# Altium integrated library AltiumLibs.IntLib: 395 symbols (part 2 of 2)
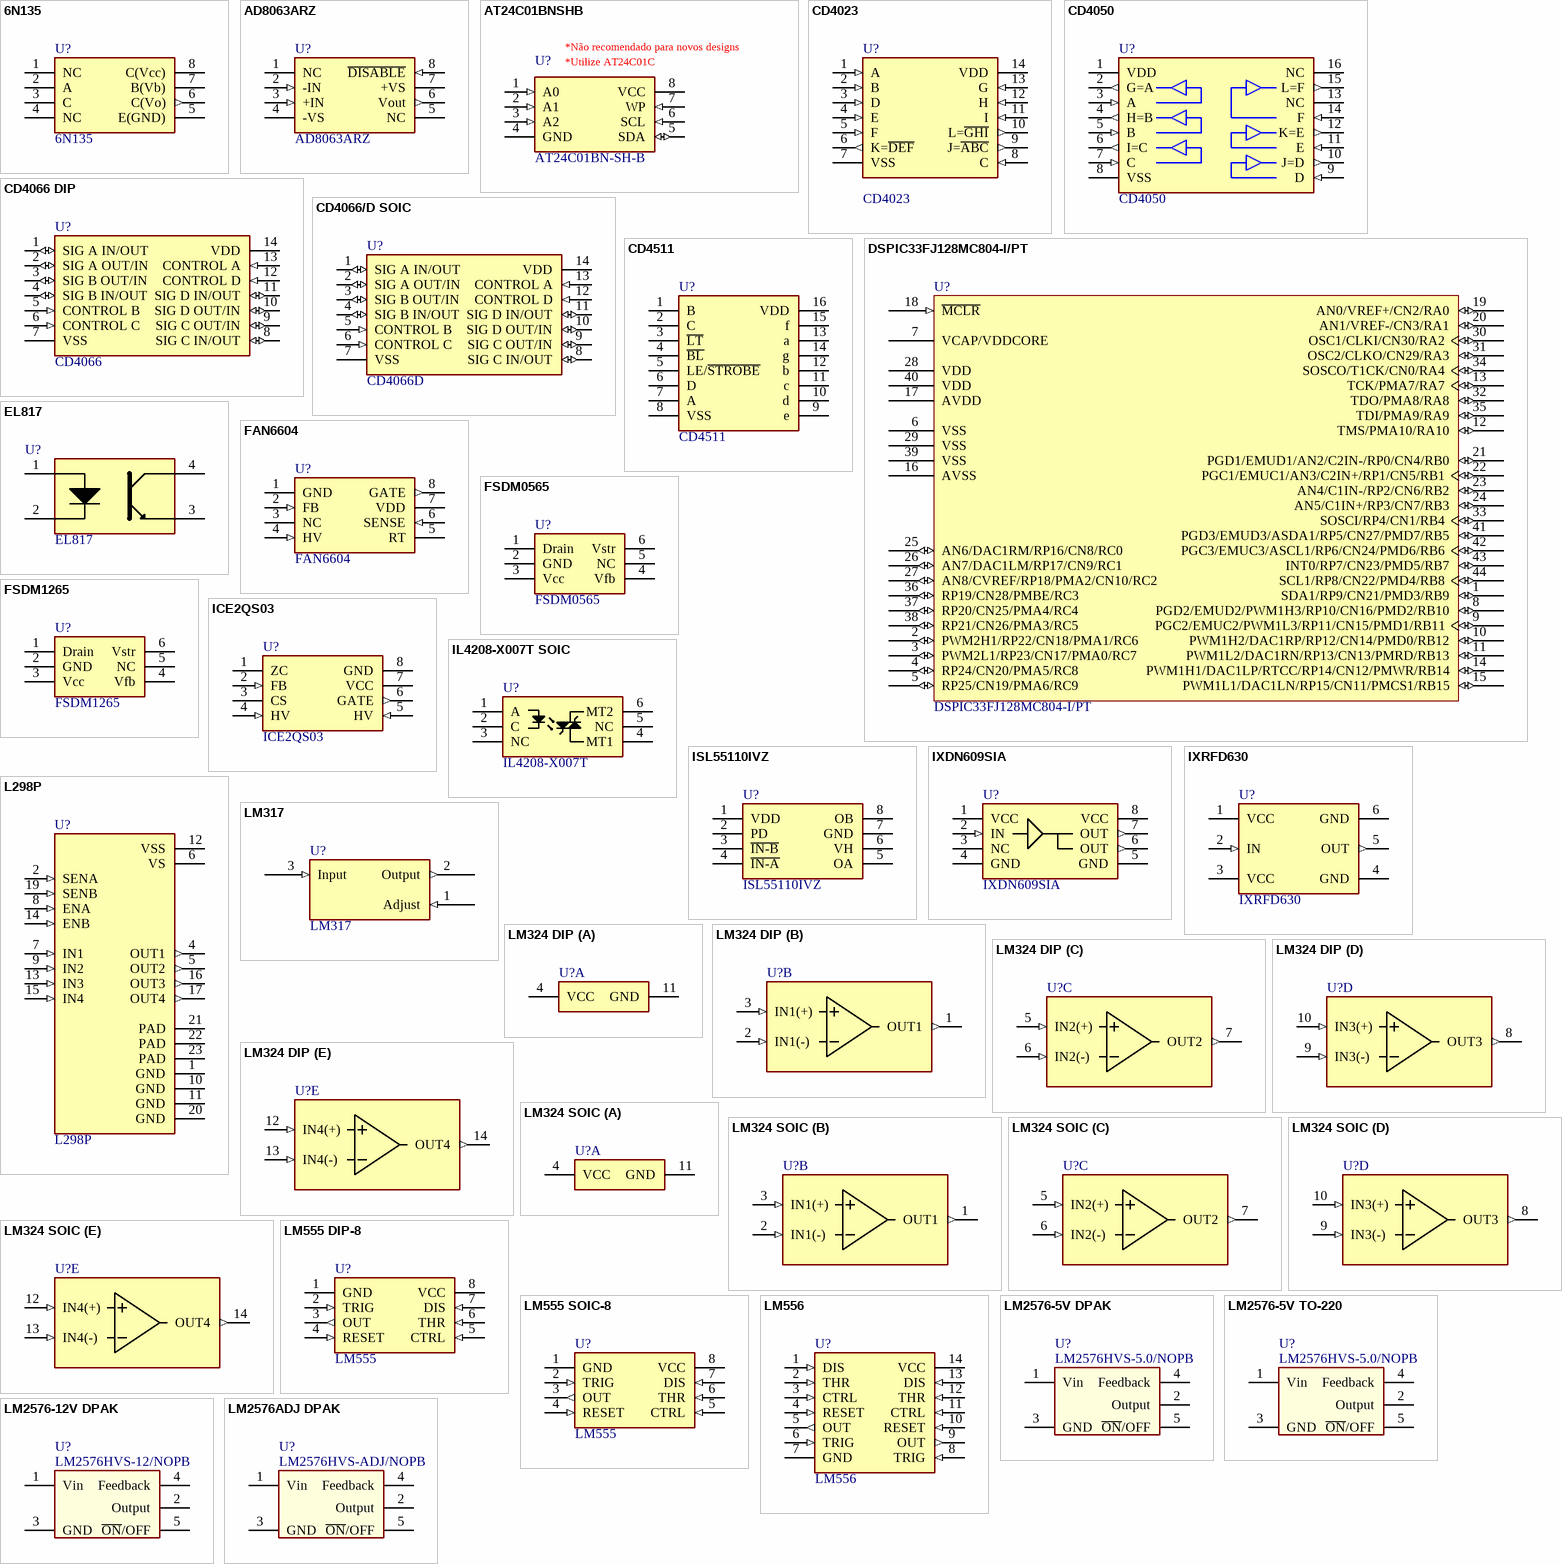
[diagram p16: symbols 6N135 to LM2576ADJ DPAK]

## LM324 DIP
designator U?  (value not drawn)
LM324 DIP Quad Operational Amplifier; Montagem: PTH; ComponentLink1Description: Datasheet; ComponentLink1URL: https://www.fairchildsemi.com/datasheets/LM/LM324.pdf; Fabricante: *; Valor/Partnumber: LM324
footprint DIP14
part A pins: 4 VCC (power), 11 GND (power)
part B pins: 1 OUT1 (out), 2 IN1(-) (in), 3 IN1(+) (in)
part C pins: 5 IN2(+) (in), 6 IN2(-) (in), 7 OUT2 (out)
part D pins: 8 OUT3 (out), 9 IN3(-) (in), 10 IN3(+) (in)
part E pins: 12 IN4(+) (in), 13 IN4(-) (in), 14 OUT4 (out)

## LM324 SOIC
designator U?  (value not drawn)
LM324 SOIC Quad Operational Amplifier; Montagem: SMD; ComponentLink1Description: Datasheet; ComponentLink1URL: https://www.fairchildsemi.com/datasheets/LM/LM324.pdf; Fabricante: *; Valor/Partnumber: LM324
footprint DIP14
part A pins: 4 VCC (power), 11 GND (power)
part B pins: 1 OUT1 (out), 2 IN1(-) (in), 3 IN1(+) (in)
part C pins: 5 IN2(+) (in), 6 IN2(-) (in), 7 OUT2 (out)
part D pins: 8 OUT3 (out), 9 IN3(-) (in), 10 IN3(+) (in)
part E pins: 12 IN4(+) (in), 13 IN4(-) (in), 14 OUT4 (out)

## LM555 DIP-8
designator U?, comment Valor/Partnumber: LM555  (hidden comment: LM555 Timer)
LM555 Timer DIP; Montagem: PTH; Fabricante: Texas; ComponentLink1Description: Datasheet; ComponentLink1URL: http://www.ti.com/lit/ds/symlink/lm555.pdf
footprint DIP8
pins: 1 GND (power), 2 TRIG (in), 3 OUT (out), 4 RESET (in), 5 CTRL (in), 6 THR (in), 7 DIS (in), 8 VCC (power)

## LM555 SOIC-8
designator U?, comment Valor/Partnumber: LM555  (hidden comment: LM555 Timer SOIC)
Montagem: SMD; Fabricante: Texas; ComponentLink1Description: Datasheet; ComponentLink1URL: http://www.ti.com/lit/ds/symlink/lm555.pdf
footprint SOIC-8 (SOIC, 8-Leads, Body 5,0x4,0mm (max), Pitch 1,27mm, IPC Medium Density)
pins: 1 GND (power), 2 TRIG (in), 3 OUT (out), 4 RESET (in), 5 CTRL (in), 6 THR (in), 7 DIS (in), 8 VCC (power)

## LM556
designator U?, comment Valor/Partnumber: LM556  (hidden comment: LM556 Dual Timer)
Montagem: PTH; Fabricante: Texas; ComponentLink1Description: Datasheet; ComponentLink1URL: http://www.ti.com/lit/ds/symlink/lm556.pdf
footprint DIP14
pins: 1 DIS (in), 2 THR (in), 3 CTRL (in), 4 RESET (in), 5 OUT (out), 6 TRIG (in), 7 GND (power), 8 TRIG (in), 9 OUT (out), 10 RESET (in), 11 CTRL (in), 12 THR (in), 13 DIS (in), 14 VCC (power)

## LM2576-5V DPAK
designator U?  (value not drawn)
LM2576HVS-5.0/NOPB; Montagem: SMD; ComponentLink1Description: Datasheet; ComponentLink1URL: http://www.ti.com/product/LM2576; Valor/Partnumber: LM2576HVS-5.0/NOPB
footprint DPAK -TO263 - 5 leads
pins: 1 Vin (power), 2 Output (power), 3 GND (power), 4 Feedback, 5 ~{ON}/OFF

## LM2576-5V TO-220
designator U?  (value not drawn)
LM2576HVS-5.0/NOPB; Montagem: PTH; ComponentLink1Description: Datasheet; ComponentLink1URL: http://www.ti.com/lit/ds/symlink/lm2576.pdf; Valor/Partnumber: LM2576HVS-5.0/NOPB
footprint TO-220-5
pins: 1 Vin (power), 2 Output (power), 3 GND (power), 4 Feedback, 5 ~{ON}/OFF

## LM2576-12V DPAK
designator U?  (value not drawn)
LM2576HVS-12/NOPB; Montagem: SMD; ComponentLink1Description: Datasheet; ComponentLink1URL: http://www.ti.com/product/LM2576; Valor/Partnumber: LM2576HVS-12/NOPB
footprint DPAK -TO263 - 5 leads
pins: 1 Vin (power), 2 Output (power), 3 GND (power), 4 Feedback, 5 ~{ON}/OFF

## LM2576ADJ DPAK
designator U?  (value not drawn)
LM2576HVS-ADJ/NOPB; Montagem: SMD; ComponentLink1Description: Datasheet; ComponentLink1URL: http://www.ti.com/product/LM2576; Valor/Partnumber: LM2576HVS-ADJ/NOPB
footprint DPAK -TO263 - 5 leads
pins: 1 Vin (power), 2 Output (power), 3 GND (power), 4 Feedback, 5 ~{ON}/OFF

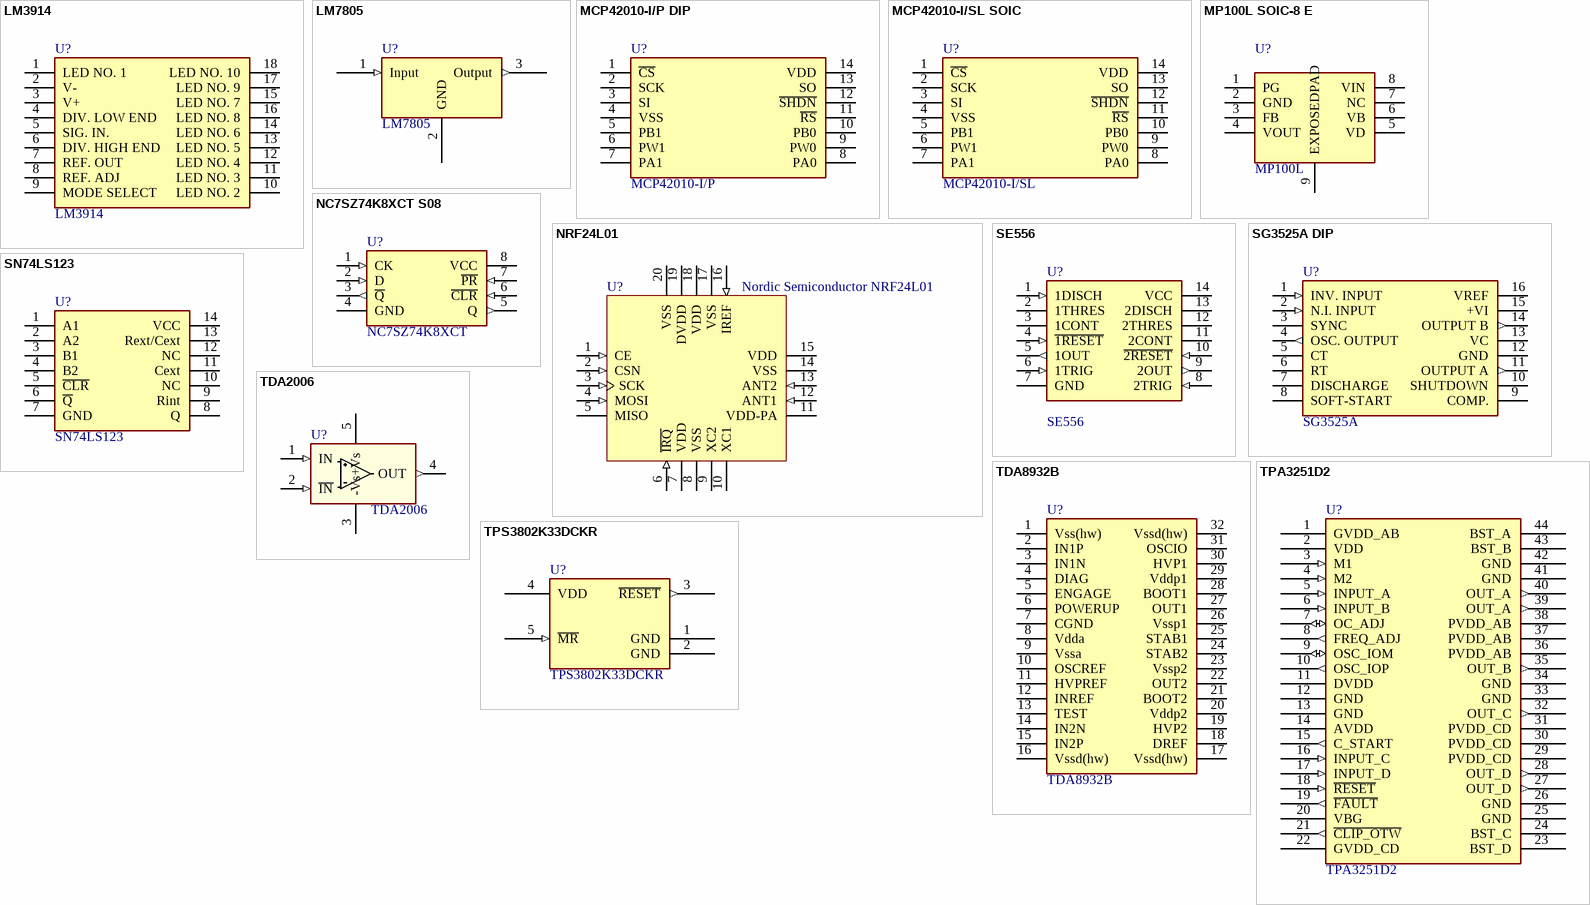
[diagram p9: symbols LM3914 to TPS3802K33DCKR]

## LM3914
designator U?
Montagem: PTH; ComponentLink1Description: Datasheet; ComponentLink1URL: http://www.ti.com/lit/ds/symlink/lm3914.pdf; Valor/Partnumber: LM3914
footprint DIP18
pins: 1 LED NO. 1, 2 V- (power), 3 V+ (power), 4 DIV. LOW END, 5 SIG. IN., 6 DIV. HIGH END, 7 REF. OUT, 8 REF. ADJ, 9 MODE SELECT, 10 LED NO. 2, 11 LED NO. 3, 12 LED NO. 4, 13 LED NO. 5, 14 LED NO. 6, 15 LED NO. 7, 16 LED NO. 8, 17 LED NO. 9, 18 LED NO. 10

## LM7805
designator U?
Montagem: PTH; ComponentLink1Description: Datasheet; ComponentLink1URL: *; Valor/Partnumber: LM7805
footprint TO-220 (TO, Thru-Hole, Vertical, Heatsink Mounted; 3 In-Line Leads; Pitch 2.54 mm)
pins: 1 Input (in), 2 GND (power), 3 Output (out)

## MCP42010-I/P DIP
designator U?  Valor/Partnumber: MCP42010-I/P  (hidden comment: MCP42010-I/P DIP)
MCP42010-I/P Dual Digital Potentiometer with SPI Interface; Montagem: PTH; ComponentLink1Description: Datasheet; ComponentLink1URL: http://ww1.microchip.com/downloads/en/DeviceDoc/11195c.pdf
footprint DIP14
pins: 1 ~{CS}, 2 SCK, 3 SI, 4 VSS (power), 5 PB1, 6 PW1, 7 PA1, 8 PA0, 9 PW0, 10 PB0, 11 ~{RS}, 12 ~{SHDN}, 13 SO, 14 VDD (power)

## MCP42010-I/SL SOIC
designator U?  Valor/Partnumber: MCP42010-I/SL  (hidden comment: MCP42010-I/SL SOIC)
MCP42010-I/SL Dual Digital Potentiometer with SPI Interface; Montagem: SMD; ComponentLink1Description: Datasheet; ComponentLink1URL: http://ww1.microchip.com/downloads/en/DeviceDoc/11195c.pdf
footprint SO-14 (SOIC, 14-Leads, Pitch 1,27mm)
pins: 1 ~{CS}, 2 SCK, 3 SI, 4 VSS (power), 5 PB1, 6 PW1, 7 PA1, 8 PA0, 9 PW0, 10 PB0, 11 ~{RS}, 12 ~{SHDN}, 13 SO, 14 VDD (power)

## MP100L SOIC-8 E
designator U?, comment MP100L
MP100L SOIC-8 E; Montagem: PTH; ComponentLink1Description: Datasheet; ComponentLink1URL: *; Valor/Partnumber: MP100L
footprint SOIC-8E (SOIC, 8-Leads, Body 5,0x4,0mm (max), Pitch 1,27mm, IPC Medium Density)
pins: 1 PG, 2 GND (power), 3 FB, 4 VOUT (power), 5 VD, 6 VB, 7 NC, 8 VIN (power), 9 EXPOSEDPAD

## NC7SZ74K8XCT S08
designator U?  Valor/Partnumber: NC7SZ74K8XCT  (hidden comment: NC7SZ74K8XCT S08)
Flip Flop D; Montagem: SMD; Fabricante: Fairchild; ComponentLink1Description: Datasheet; ComponentLink1URL: *
footprint US8
pins: 1 CK (in), 2 D (in), 3 ~{Q} (out), 4 GND (power), 5 Q (out), 6 ~{CLR} (in), 7 ~{PR} (in), 8 VCC (power)

## NRF24L01
designator U?, comment Nordic Semiconductor NRF24L01
Ic Txrx 2.4ghz Enh/b Shock 20qfn
footprint nRF2401 (QFN20G-0.5-4X4MM)
pins: 1 CE (in), 2 CSN (in), 3 SCK (in), 4 MOSI (in), 5 MISO (hiz), 6 ~{IRQ} (in), 7 VDD (power), 8 VSS, 9 XC2, 10 XC1, 11 VDD-PA (power), 12 ANT1 (in), 13 ANT2 (in), 14 VSS (power), 15 VDD (power), 16 IREF (in), 17 VSS (power), 18 VDD (power), 19 DVDD (power), 20 VSS (power)

## SE556
designator U?
Montagem: PTH; ComponentLink1Description: Datasheet; Valor/Partnumber: SE556
footprint DIP14
pins: 1 1DISCH (in), 2 1THRES, 3 1CONT, 4 ~{1RESET} (in), 5 1OUT (out), 6 1TRIG (in), 7 GND (power), 8 2TRIG (in), 9 2OUT (out), 10 ~{2RESET} (in), 11 2CONT, 12 2THRES, 13 2DISCH, 14 VCC (power)

## SG3525A DIP
designator U?  Valor/Partnumber: SG3525A  (hidden comment: SG3525A DIP)
CIRCUITO INTEGRADO SG3525A; Montagem: PTH; Fabricante: ST; ComponentLink1Description: Datasheet; ComponentLink1URL: http://www.st.com/web/en/resource/technical/document/datasheet/CD00000958.pdf
footprint DIP16
pins: 1 INV. INPUT (in), 2 N.I. INPUT (in), 3 SYNC, 4 OSC. OUTPUT (out), 5 CT, 6 RT, 7 DISCHARGE, 8 SOFT-START, 9 COMP., 10 SHUTDOWN, 11 OUTPUT A (out), 12 GND (power), 13 VC (power), 14 OUTPUT B (out), 15 +VI (power), 16 VREF (power)

## SN74LS123
designator U?
SN74LS123 RETRIGGERABLE MONOSTABLE MULTIVIBRATORS; Montagem: PTH; ComponentLink1Description: Datasheet; ComponentLink1URL: http://www.ti.com/lit/ds/symlink/sn74ls123.pdf; Valor/Partnumber: SN74LS123
footprint DIP14
pins: 1 A1, 2 A2, 3 B1, 4 B2, 5 ~{CLR}, 6 ~{Q}, 7 GND (power), 8 Q, 9 Rint, 10 NC (hiz), 11 Cext, 12 NC (hiz), 13 Rext/Cext, 14 VCC (power)

## TDA2006
designator U?
TDA2006 12W AUDIO AMPLIFIER; Montagem: PTH; ComponentLink1Description: Datasheet; ComponentLink1URL: http://www.st.com/web/en/resource/technical/document/datasheet/CD00000125.pdf; Valor/Partnumber: TDA2006
footprint TO-220-5
pins: 1 IN (in), 2 ~{IN} (in), 3 -Vs (power), 4 OUT (out), 5 +Vs (power)

## TDA8932B
designator U?
TDA8932B Class-D audio amplifier; Montagem: SMD; ComponentLink1Description: Datasheet; ComponentLink1URL: http://www.nxp.com/documents/data_sheet/TDA8932B.pdf; Valor/Partnumber: TDA8932B
footprint HTSSOP32 (TSOP, 32-Leads, Body 11,00x6,10mm, Pitch 0,65mm, IPC Medium Density)
pins: 1 Vss(hw), 2 IN1P, 3 IN1N, 4 DIAG, 5 ENGAGE, 6 POWERUP, 7 CGND, 8 Vdda, 9 Vssa, 10 OSCREF, 11 HVPREF, 12 INREF, 13 TEST, 14 IN2N, 15 IN2P, 16 Vssd(hw), 17 Vssd(hw), 18 DREF, 19 HVP2, 20 Vddp2, 21 BOOT2, 22 OUT2, 23 Vssp2, 24 STAB2, 25 STAB1, 26 Vssp1, 27 OUT1, 28 BOOT1, 29 Vddp1, 30 HVP1, 31 OSCIO, 32 Vssd(hw)

## TPA3251D2
designator U?
Fabricante: Texas Instruments; Montagem: SMD; ComponentLink1URL: http://www.ti.com/lit/ds/symlink/tpa3251d2.pdf; ComponentLink1Description: Datasheet; Valor/Partnumber: TPA3251D2
footprint TSSOP44
pins: 1 GVDD_AB (power), 2 VDD (power), 3 M1 (in), 4 M2 (in), 5 INPUT_A (in), 6 INPUT_B (in), 7 OC_ADJ (io), 8 FREQ_ADJ (out), 9 OSC_IOM (io), 10 OSC_IOP (out), 11 DVDD (power), 12 GND (power), 13 GND (power), 14 AVDD (power), 15 C_START (out), 16 INPUT_C (in), 17 INPUT_D (in), 18 ~{RESET} (in), 19 ~{FAULT} (out), 20 VBG (power), 21 ~{CLIP_OTW} (out), 22 GVDD_CD (power), 23 BST_D (power), 24 BST_C (power), 25 GND (power), 26 GND (power), 27 OUT_D (out), 28 OUT_D (out), 29 PVDD_CD (power), 30 PVDD_CD (power), 31 PVDD_CD (power), 32 OUT_C (out), 33 GND (power), 34 GND (power), 35 OUT_B (out), 36 PVDD_AB (power), 37 PVDD_AB (power), 38 PVDD_AB (power), 39 OUT_A (out), 40 OUT_A (out), 41 GND (power), 42 GND (power), 43 BST_B (power), 44 BST_A (power)

## TPS3802K33DCKR
designator U?
ULTRA-SMALL SUPPLY VOLTAGE SUPERVISORS; Fabricante: Texas Instruments; Montagem: SMD; ComponentLink1Description: Datasheet; ComponentLink1URL: http://www.ti.com/lit/ds/symlink/tps3802k33.pdf; Valor/Partnumber: TPS3802K33DCKR
footprint SC70-5 (SC-70, 5-Leads)
pins: 1 GND (power), 2 GND (power), 3 ~{RESET} (out), 4 VDD (power), 5 ~{MR} (in)


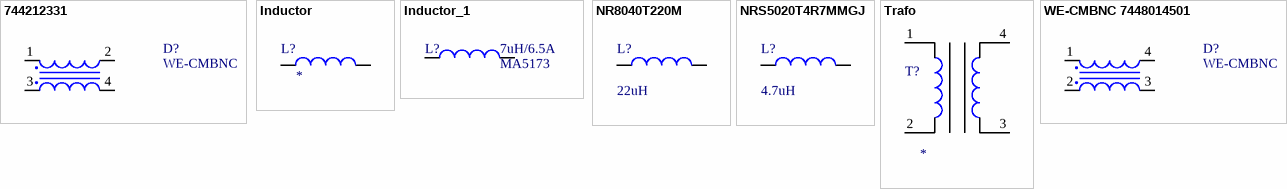
[diagram p10: symbols 744212331 to WE-CMBNC 7448014501]

## 744212331
designator D?, comment WE-CMBNC
CMC 330UH 300MA 2LN 2 KOHM SMD; Valor/Partnumber: CMC 330UH 744212331; Montagem: PTH; Fornecedor1: Wurth; ComponentLinkDescription1: Datasheet
footprint 744212331
pins: 1, 2, 3, 4

## Inductor
designator L?  (value not drawn)
Value: *
footprint Ind 10mm (Indutor radial corpo 10mm)
footprint TrafoInductor
pins: 1, 2

## Inductor_1
designator L?, comment MA5173  value 7uH/6.5A
Inductor; Code_IEC: 1005; LatestRevisionDate: 29-May-2009; LatestRevisionNote: IPC-7351 Footprint Added.; PackageReference: 0402-A; Publisher: Altium Limited; PackageDescription: Chip Inductor; Code_JEITA: 0402
footprint Ind 10mm (Indutor radial corpo 10mm)
footprint Inductor MA5173-AE (Inductor MA5173-AE CoilCraft)
pins: 1, 2

## NR8040T220M
designator L?, comment 22uH
FIXED IND 22UH 2.2A 85.8 MOHM; Valor/Partnumber: 22uH 2.2A NR8040T220M
footprint NR8040
pins: 1, 2

## NRS5020T4R7MMGJ
designator L?, comment 4.7uH
FIXED IND 4.7UH 2A 72 MOHM SMD; Valor/Partnumber: 4.7uH 2A NRS5020T4R7MMGJ
footprint NRS5020
pins: 1, 2

## Trafo
designator T?  (value not drawn)
Value: *
footprint Trafo
pins: 1, 2, 3, 4

## WE-CMBNC 7448014501
designator D?, comment WE-CMBNC
WE-CMBNC Common Mode Power Line  Choke Nanocrystalline; Montagem: PTH; Fornecedor1: Wurth; ComponentLinkDescription1: Datasheet; Valor/Partnumber: WE-CMBNC
footprint InductorWurth100x45
pins: 1, 2, 3, 4


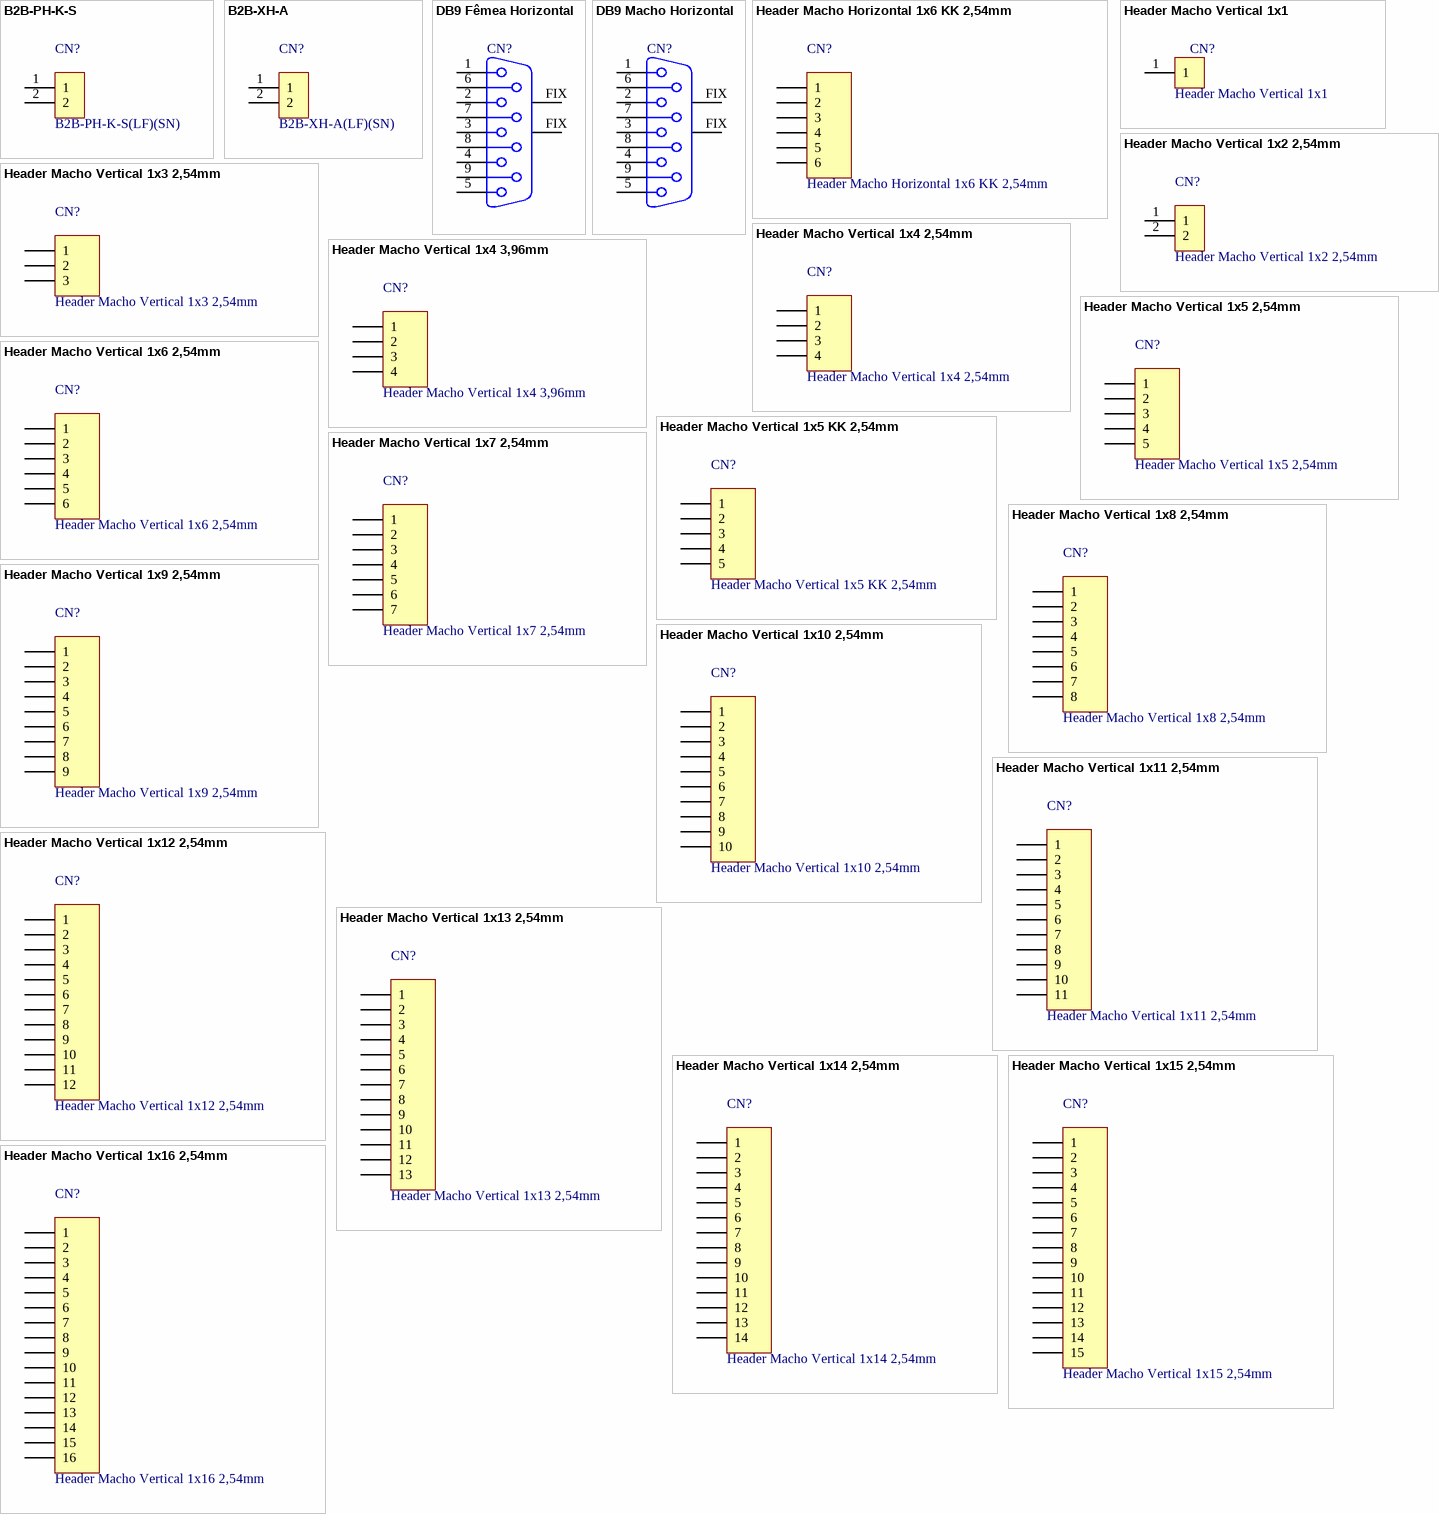
[diagram p11: symbols B2B-PH-K-S to Header Macho Vertical 1x16 2,54mm]

## B2B-PH-K-S
designator CN?  Valor/Partnumber: B2B-PH-K-S(LF)(SN)  (hidden comment: B2B-PH-K-S)
CONN HEADER VERT 2POS 2MM; Montagem: PTH
footprint B2B-PH-K-S (Footprint not found)
pins: 1, 2

## B2B-XH-A
designator CN?  Valor/Partnumber: B2B-XH-A(LF)(SN)  (hidden comment: B2B-XH-A)
CONN HEADER VERT 2POS 2.5MM; Montagem: PTH
footprint B2B-XH-A
pins: 1, 2

## DB9 Fêmea Horizontal
designator CN?  (value not drawn)
Montagem: PTH; Valor/Partnumber: DB9 Fêmea Horizontal
footprint DB9_Female_PTH (DB9, Female, 90º, PTH)
pins: 1, 2, 3, 4, 5, 6, 7, 8, 9, FIX MH2, FIX MH1

## DB9 Macho Horizontal
designator CN?  (value not drawn)
Montagem: PTH; Valor/Partnumber: DB9 Macho Horizontal
footprint DB9_Male_PTH (DB9, Male, 90º, PTH)
pins: 1, 2, 3, 4, 5, 6, 7, 8, 9, FIX MH2, FIX MH1

## Header Macho Horizontal 1x6 KK 2,54mm
designator CN?
Header Macho Horizontal com trava KK 1x6 2,54mm; Montagem: PTH; Valor/Partnumber: Header Macho Horizontal 1x6 KK 2,54mm
footprint HDR1X6HKK (Connector; Header; 6 Position; Right Angle)
pins: 1, 2, 3, 4, 5, 6

## Header Macho Vertical 1x1
designator CN?
Montagem: PTH; Valor/Partnumber: Header Macho Vertical 1x1
footprint HDR1X1 (Connector; Header; 1 Position)
pins: 1

## Header Macho Vertical 1x2 2,54mm
designator CN?
Montagem: PTH; Valor/Partnumber: Header Macho Vertical 1x2 2,54mm
footprint HDR1X2 (Connector; Header; 2 Position)
pins: 1, 2

## Header Macho Vertical 1x3 2,54mm
designator CN?
Montagem: PTH; Valor/Partnumber: Header Macho Vertical 1x3 2,54mm
footprint HDR1X3 (Connector; Header; 3 Position)
pins: 1, 2, 3

## Header Macho Vertical 1x4 2,54mm
designator CN?
Montagem: PTH; Valor/Partnumber: Header Macho Vertical 1x4 2,54mm
footprint HDR1X4 (Connector; Header; 4 Position)
pins: 1, 2, 3, 4

## Header Macho Vertical 1x4 3,96mm
designator CN?
Montagem: PTH; Valor/Partnumber: Header Macho Vertical 1x4 3,96mm
footprint HDR1X4KKzao (3.96)
pins: 1, 2, 3, 4

## Header Macho Vertical 1x5 2,54mm
designator CN?
Montagem: PTH; Valor/Partnumber: Header Macho Vertical 1x5 2,54mm
footprint HDR1X5 (Connector; Header; 5 Position)
pins: 1, 2, 3, 4, 5

## Header Macho Vertical 1x5 KK 2,54mm
designator CN?
Header Macho Vertical com trava KK 1x5 2,54mm; Montagem: PTH; Valor/Partnumber: Header Macho Vertical 1x5 KK 2,54mm
footprint HDR1X5KK (Connector; Header; 5 Position)
pins: 1, 2, 3, 4, 5

## Header Macho Vertical 1x6 2,54mm
designator CN?
Montagem: PTH; Valor/Partnumber: Header Macho Vertical 1x6 2,54mm
footprint HDR1X6 (Connector; Header; 6 Position)
pins: 1, 2, 3, 4, 5, 6

## Header Macho Vertical 1x7 2,54mm
designator CN?
Montagem: PTH; Valor/Partnumber: Header Macho Vertical 1x7 2,54mm
footprint HDR1X7 (Connector; Header; 7 Position)
pins: 1, 2, 3, 4, 5, 6, 7

## Header Macho Vertical 1x8 2,54mm
designator CN?
Montagem: PTH; Valor/Partnumber: Header Macho Vertical 1x8 2,54mm
footprint HDR1X8 (Connector; Header; 8 Position)
pins: 1, 2, 3, 4, 5, 6, 7, 8

## Header Macho Vertical 1x9 2,54mm
designator CN?
Montagem: PTH; Valor/Partnumber: Header Macho Vertical 1x9 2,54mm
footprint HDR1X9 (Connector; Header; 9 Position)
pins: 1, 2, 3, 4, 5, 6, 7, 8, 9

## Header Macho Vertical 1x10 2,54mm
designator CN?
Montagem: PTH; Valor/Partnumber: Header Macho Vertical 1x10 2,54mm
footprint HDR1X10 (Connector; Header; 10 Position)
pins: 1, 2, 3, 4, 5, 6, 7, 8, 9, 10

## Header Macho Vertical 1x11 2,54mm
designator CN?
Montagem: PTH; Valor/Partnumber: Header Macho Vertical 1x11 2,54mm
footprint HDR1X11 (Connector; Header; 11 Position)
pins: 1, 2, 3, 4, 5, 6, 7, 8, 9, 10, 11

## Header Macho Vertical 1x12 2,54mm
designator CN?
Montagem: PTH; Valor/Partnumber: Header Macho Vertical 1x12 2,54mm
footprint HDR1X12 (Connector; Header; 12 Position)
pins: 1, 2, 3, 4, 5, 6, 7, 8, 9, 10, 11, 12

## Header Macho Vertical 1x13 2,54mm
designator CN?
Montagem: PTH; Valor/Partnumber: Header Macho Vertical 1x13 2,54mm
footprint HDR1X13 (Connector; Header; 13 Position)
pins: 1, 2, 3, 4, 5, 6, 7, 8, 9, 10, 11, 12, 13

## Header Macho Vertical 1x14 2,54mm
designator CN?
Montagem: PTH; Valor/Partnumber: Header Macho Vertical 1x14 2,54mm
footprint HDR1X14 (Connector; Header; 14 Position)
pins: 1, 2, 3, 4, 5, 6, 7, 8, 9, 10, 11, 12, 13, 14

## Header Macho Vertical 1x15 2,54mm
designator CN?
Montagem: PTH; Valor/Partnumber: Header Macho Vertical 1x15 2,54mm
footprint HDR1X15 (Connector; Header; 15 Position)
pins: 1, 2, 3, 4, 5, 6, 7, 8, 9, 10, 11, 12, 13, 14, 15

## Header Macho Vertical 1x16 2,54mm
designator CN?
Montagem: PTH; Valor/Partnumber: Header Macho Vertical 1x16 2,54mm
footprint HDR1X16 (Connector; Header; 16 Position)
pins: 1, 2, 3, 4, 5, 6, 7, 8, 9, 10, 11, 12, 13, 14, 15, 16
